# Altium footprint library 6-Connectors-1.PcbLib: 54 footprints (part 2 of 5) (continued)
## HARTING_02 04 160 1101 [mm] "PCB connector, DIN 41612, har-bus 64, 160 poles, Angled solder pins, 3.0 mm, Male contacts, Four first mating contacts, Performance level 2 as per IEC 60603-2, Row pitch: 2.54 mm, Without fixing"
height 10.7
pads (162):
  round 1.5 hole 1: a1(-2.54,-78.74) a2(-2.54,-76.2) a3(-2.54,-73.66) a4(-2.54,-71.12) a5(-2.54,-68.58) a6(-2.54,-66.04) a7(-2.54,-63.5) a8(-2.54,-60.96) a9(-2.54,-58.42) a10(-2.54,-55.88) a11(-2.54,-53.34) a12(-2.54,-50.8) a13(-2.54,-48.26) a14(-2.54,-45.72) a15(-2.54,-43.18) a16(-2.54,-40.64) a17(-2.54,-38.1) a18(-2.54,-35.56) a19(-2.54,-33.02) a20(-2.54,-30.48) a21(-2.54,-27.94) a22(-2.54,-25.4) a23(-2.54,-22.86) a24(-2.54,-20.32) a25(-2.54,-17.78) a26(-2.54,-15.24) a27(-2.54,-12.7) a28(-2.54,-10.16) a29(-2.54,-7.62) a30(-2.54,-5.08) a31(-2.54,-2.54) a32(-2.54,0) b1(-5.08,-78.74) b2(-5.08,-76.2) b3(-5.08,-73.66) b4(-5.08,-71.12) b5(-5.08,-68.58) b6(-5.08,-66.04) b7(-5.08,-63.5) b8(-5.08,-60.96) b9(-5.08,-58.42) b10(-5.08,-55.88) b11(-5.08,-53.34) b12(-5.08,-50.8) b13(-5.08,-48.26) b14(-5.08,-45.72) b15(-5.08,-43.18) b16(-5.08,-40.64) b17(-5.08,-38.1) b18(-5.08,-35.56) b19(-5.08,-33.02) b20(-5.08,-30.48) b21(-5.08,-27.94) b22(-5.08,-25.4) b23(-5.08,-22.86) b24(-5.08,-20.32) b25(-5.08,-17.78) b26(-5.08,-15.24) b27(-5.08,-12.7) b28(-5.08,-10.16) b29(-5.08,-7.62) b30(-5.08,-5.08) b31(-5.08,-2.54) b32(-5.08,0) c1(-7.62,-78.74) c2(-7.62,-76.2) c3(-7.62,-73.66) c4(-7.62,-71.12) c5(-7.62,-68.58) c6(-7.62,-66.04) c7(-7.62,-63.5) c8(-7.62,-60.96) c9(-7.62,-58.42) c10(-7.62,-55.88) c11(-7.62,-53.34) c12(-7.62,-50.8) c13(-7.62,-48.26) c14(-7.62,-45.72) c15(-7.62,-43.18) c16(-7.62,-40.64) c17(-7.62,-38.1) c18(-7.62,-35.56) c19(-7.62,-33.02) c20(-7.62,-30.48) c21(-7.62,-27.94) c22(-7.62,-25.4) c23(-7.62,-22.86) c24(-7.62,-20.32) c25(-7.62,-17.78) c26(-7.62,-15.24) c27(-7.62,-12.7) c28(-7.62,-10.16) c29(-7.62,-7.62) c30(-7.62,-5.08) c31(-7.62,-2.54) c32(-7.62,0) d1(-10.16,-78.74) d2(-10.16,-76.2) d3(-10.16,-73.66) d4(-10.16,-71.12) d5(-10.16,-68.58) d6(-10.16,-66.04) d7(-10.16,-63.5) d8(-10.16,-60.96) d9(-10.16,-58.42) d10(-10.16,-55.88) d11(-10.16,-53.34) d12(-10.16,-50.8) d13(-10.16,-48.26) d14(-10.16,-45.72) d15(-10.16,-43.18) d16(-10.16,-40.64) d17(-10.16,-38.1) d18(-10.16,-35.56) d19(-10.16,-33.02) d20(-10.16,-30.48) d21(-10.16,-27.94) d22(-10.16,-25.4) d23(-10.16,-22.86) d24(-10.16,-20.32) d25(-10.16,-17.78) d26(-10.16,-15.24) d27(-10.16,-12.7) d28(-10.16,-10.16) d29(-10.16,-7.62) d30(-10.16,-5.08) d31(-10.16,-2.54) d32(-10.16,0) z1(0,-78.74) z2(0,-76.2) z3(0,-73.66) z4(0,-71.12) z5(0,-68.58) z6(0,-66.04) z7(0,-63.5) z8(0,-60.96) z9(0,-58.42) z10(0,-55.88) z11(0,-53.34) z12(0,-50.8) z13(0,-48.26) z14(0,-45.72) z15(0,-43.18) z16(0,-40.64) z17(0,-38.1) z18(0,-35.56) z19(0,-33.02) z20(0,-30.48) z21(0,-27.94) z22(0,-25.4) z23(0,-22.86) z24(0,-20.32) z25(0,-17.78) z26(0,-15.24) z27(0,-12.7) z28(0,-10.16) z29(0,-7.62) z30(0,-5.08) z31(0,-2.54) z32(0,0)
  round 3.5 / inner round 3.5 / far side round 5.1 hole 2.8: MTG1(0,5.08) MTG2(0,-83.82)
Top Overlay:
  lines w0.2: -6.4,-83.82 -2.944,-83.82 ; -6.4,-80.77 -12.3,-80.77 -12.3,1.53 -6.4,1.53 ; -6.4,5.08 -2.944,5.08 ; -1.15,-86.27 -6.4,-86.27 -6.4,7.53 -1.15,7.53 ; 1.3,-86.27 ccw(c1.3,-84.67) 2.9,-84.67 2.9,-82.57 4.1,-81.37 4.1,-80.77 ; 1.3,7.53 cw(c1.3,5.93) 2.9,5.93 2.9,3.83 4.1,2.63 4.1,2.08 ; 3.7,-81.77 12.6,-81.77 12.6,3.03 3.7,3.03 ; 12.6,-80.77 1.25,-80.77 1.25,2.03 12.6,2.03
  text "1" at -13.5,-79.315 h1.2
  text "32" at -15.03,-0.615 h1.2
  text "5" at -13.955,-69.195 h1.2
  text "10" at -14.825,-56.505 h1.2
  text "15" at -14.825,-43.805 h1.2
  text "20" at -15.005,-31.115 h1.2
  text "25" at -15.055,-18.39 h1.2
  text "30" at -15.005,-5.69 h1.2
  text "c" at -8.128,2.262 h1.2
  text "b" at -5.461,1.317 h1.2
  text "a" at -2.921,1.317 h1.2
  text "z" at -0.35,1.317 h1.2
  text "d" at -10.795,2.262 h1.2
Mechanical 1:
  text "d" at -10.795,2.262 h1.2
  text "z" at -0.35,1.317 h1.2
  text "a" at -2.921,1.317 h1.2
  text "b" at -5.461,1.317 h1.2
  text "c" at -8.128,2.262 h1.2
Mechanical 8:
  drawing of 686 lines, arcs and shapes, not listed
  text "PCB" at 2.54,-41.275 h1.5
Mechanical 14:
  drawing of 224 lines, arcs and shapes, not listed
  text "1" at -13.5,-79.315 h1.2
  text "32" at -15.03,-0.615 h1.2
  text "5" at -13.955,-69.195 h1.2
  text "10" at -14.825,-56.505 h1.2
  text "15" at -14.825,-43.805 h1.2
  text "20" at -15.005,-31.115 h1.2
  text "25" at -15.055,-18.39 h1.2
  text "30" at -15.005,-5.69 h1.2
3D body "HARTING_02 04 160 1101.stp": height 10.65, standoff -2.95, extent -12.3,-86.27 12.6,7.53

## HARTING_02 07 160 1101 [mm] "Extender Card Female Connector; Har-bus 64, 17mm Pres-in Terminations; Rows z+a+b+c+d, 160 Female Contacts"
height 11.95
pads (162):
  round 1.7 hole 1: a1(-2.54,-78.74) a2(-2.54,-76.2) a3(-2.54,-73.66) a4(-2.54,-71.12) a5(-2.54,-68.58) a6(-2.54,-66.04) a7(-2.54,-63.5) a8(-2.54,-60.96) a9(-2.54,-58.42) a10(-2.54,-55.88) a11(-2.54,-53.34) a12(-2.54,-50.8) a13(-2.54,-48.26) a14(-2.54,-45.72) a15(-2.54,-43.18) a16(-2.54,-40.64) a17(-2.54,-38.1) a18(-2.54,-35.56) a19(-2.54,-33.02) a20(-2.54,-30.48) a21(-2.54,-27.94) a22(-2.54,-25.4) a23(-2.54,-22.86) a24(-2.54,-20.32) a25(-2.54,-17.78) a26(-2.54,-15.24) a27(-2.54,-12.7) a28(-2.54,-10.16) a29(-2.54,-7.62) a30(-2.54,-5.08) a31(-2.54,-2.54) a32(-2.54,0) b1(-5.08,-78.74) b2(-5.08,-76.2) b3(-5.08,-73.66) b4(-5.08,-71.12) b5(-5.08,-68.58) b6(-5.08,-66.04) b7(-5.08,-63.5) b8(-5.08,-60.96) b9(-5.08,-58.42) b10(-5.08,-55.88) b11(-5.08,-53.34) b12(-5.08,-50.8) b13(-5.08,-48.26) b14(-5.08,-45.72) b15(-5.08,-43.18) b16(-5.08,-40.64) b17(-5.08,-38.1) b18(-5.08,-35.56) b19(-5.08,-33.02) b20(-5.08,-30.48) b21(-5.08,-27.94) b22(-5.08,-25.4) b23(-5.08,-22.86) b24(-5.08,-20.32) b25(-5.08,-17.78) b26(-5.08,-15.24) b27(-5.08,-12.7) b28(-5.08,-10.16) b29(-5.08,-7.62) b30(-5.08,-5.08) b31(-5.08,-2.54) b32(-5.08,0) c1(-7.62,-78.74) c2(-7.62,-76.2) c3(-7.62,-73.66) c4(-7.62,-71.12) c5(-7.62,-68.58) c6(-7.62,-66.04) c7(-7.62,-63.5) c8(-7.62,-60.96) c9(-7.62,-58.42) c10(-7.62,-55.88) c11(-7.62,-53.34) c12(-7.62,-50.8) c13(-7.62,-48.26) c14(-7.62,-45.72) c15(-7.62,-43.18) c16(-7.62,-40.64) c17(-7.62,-38.1) c18(-7.62,-35.56) c19(-7.62,-33.02) c20(-7.62,-30.48) c21(-7.62,-27.94) c22(-7.62,-25.4) c23(-7.62,-22.86) c24(-7.62,-20.32) c25(-7.62,-17.78) c26(-7.62,-15.24) c27(-7.62,-12.7) c28(-7.62,-10.16) c29(-7.62,-7.62) c30(-7.62,-5.08) c31(-7.62,-2.54) c32(-7.62,0) d1(-10.16,-78.74) d2(-10.16,-76.2) d3(-10.16,-73.66) d4(-10.16,-71.12) d5(-10.16,-68.58) d6(-10.16,-66.04) d7(-10.16,-63.5) d8(-10.16,-60.96) d9(-10.16,-58.42) d10(-10.16,-55.88) d11(-10.16,-53.34) d12(-10.16,-50.8) d13(-10.16,-48.26) d14(-10.16,-45.72) d15(-10.16,-43.18) d16(-10.16,-40.64) d17(-10.16,-38.1) d18(-10.16,-35.56) d19(-10.16,-33.02) d20(-10.16,-30.48) d21(-10.16,-27.94) d22(-10.16,-25.4) d23(-10.16,-22.86) d24(-10.16,-20.32) d25(-10.16,-17.78) d26(-10.16,-15.24) d27(-10.16,-12.7) d28(-10.16,-10.16) d29(-10.16,-7.62) d30(-10.16,-5.08) d31(-10.16,-2.54) d32(-10.16,0) z1(0,-78.74) z2(0,-76.2) z3(0,-73.66) z4(0,-71.12) z5(0,-68.58) z6(0,-66.04) z7(0,-63.5) z8(0,-60.96) z9(0,-58.42) z10(0,-55.88) z11(0,-53.34) z12(0,-50.8) z13(0,-48.26) z14(0,-45.72) z15(0,-43.18) z16(0,-40.64) z17(0,-38.1) z18(0,-35.56) z19(0,-33.02) z20(0,-30.48) z21(0,-27.94) z22(0,-25.4) z23(0,-22.86) z24(0,-20.32) z25(0,-17.78) z26(0,-15.24) z27(0,-12.7) z28(0,-10.16) z29(0,-7.62) z30(0,-5.08) z31(0,-2.54) z32(0,0)
  round 3.5 / inner round 3.5 / far side round 5.1 hole 2.8: MTG1(0,5.08) MTG2(0,-83.82)
Top Overlay:
  lines w0.2: -6.4,-83.82 -2.944,-83.82 -2.652,-83.314 ; -6.4,-80.77 -6.4,-86.37 -0.887,-86.37 ; -6.4,1.53 -6.4,7.63 -0.887,7.63 ; -6.4,5.08 -2.944,5.08 -2.652,4.574 ; -1.765,-81.777 -1.472,-81.27 -0.887,-81.27 ; -1.765,3.036 -1.472,2.53 -0.887,2.53 ; 0.887,-86.37 12.6,-86.37 ; 0.887,-81.27 1.472,-81.27 1.765,-81.777 ; 0.887,2.53 1.472,2.53 1.765,3.036 ; 0.887,7.63 12.6,7.63 ; 1.25,-80.77 1.25,2.03 12.6,2.03 ; 1.25,1.53 -12.6,1.53 -12.6,-80.77 12.6,-80.77 ; 2.579,-83.02 2.9,-83.02 2.9,-82.57 4.1,-81.37 4.1,-80.77 ; 2.579,4.28 2.9,4.28 2.9,3.83 4.1,2.63 4.1,2.03 ; 12,-80.77 12,2.03 ; 12.6,-81.87 25.57,-81.87 26.2,-81.24 26.2,2.5 25.57,3.13 12.6,3.13 ; 14.6,-86.67 12.6,-86.67 12.6,7.93 14.6,7.93 ; 15.1,-81.87 15.1,3.13 ; 16.55,-81.87 16.55,3.13 ; 18.5,-82.27 18.504,-82.27 cw(c18.504,-82.97) 19.204,-82.97 19.204,-84.37 ; 18.5,-81.87 18.5,-84.37 19.65,-84.37 19.65,-86.82 14.6,-86.82 14.6,8.08 19.65,8.08 19.65,5.63 18.5,5.63 18.5,3.13 ; 18.503,3.53 ccw(c18.503,4.23) 19.203,4.23 19.203,5.63 ; 25.9,-81.54 25.9,2.8
  text "30" at -15.305,-5.69 h1.2
  text "25" at -15.355,-18.39 h1.2
  text "20" at -15.305,-31.115 h1.2
  text "15" at -15.125,-43.805 h1.2
  text "10" at -15.125,-56.505 h1.2
  text "5" at -14.255,-69.195 h1.2
  text "32" at -15.33,-0.615 h1.2
  text "b" at -5.53,2.225 h1.2
  text "a" at -3.365,2.215 h1.2
  text "1" at -13.8,-79.315 h1.2
  text "c" at -8.13,2.2 h1.2
  text "d" at -10.705,2.175 h1.2
Mechanical 8:
  lines w0.1: -10.66,-78.74 -10.16,-78.74 ; -10.66,0 -10.16,0 ; -10.16,-79.24 -10.16,-78.74 ; -10.16,-78.24 -10.16,-78.74 ; -10.16,-0.5 -10.16,0 ; -10.16,0.5 -10.16,0 ; -9.66,-78.74 -10.16,-78.74 ; -9.66,0 -10.16,0 ; -8.12,-78.74 -7.62,-78.74 ; -8.12,0 -7.62,0 ; -7.62,-79.24 -7.62,-78.74 ; -7.62,-78.24 -7.62,-78.74 ; -7.62,-0.5 -7.62,0 ; -7.62,0.5 -7.62,0 ; -7.12,-78.74 -7.62,-78.74 ; -7.12,0 -7.62,0 ; -5.58,-78.74 -5.08,-78.74 ; -5.58,0 -5.08,0 ; -5.434,-39.724 -5.08,-39.37 ; -5.434,-39.016 -5.08,-39.37 ; -5.08,-79.24 -5.08,-78.74 ; -5.08,-78.24 -5.08,-78.74 ; -5.08,-0.5 -5.08,0 ; -5.08,0.5 -5.08,0 ; -4.726,-39.724 -5.08,-39.37 ; -4.726,-39.016 -5.08,-39.37 ; -4.58,-78.74 -5.08,-78.74 ; -4.58,0 -5.08,0 ; -3.04,-78.74 -2.54,-78.74 ; -3.04,0 -2.54,0 ; -2.54,-79.24 -2.54,-78.74 ; -2.54,-78.24 -2.54,-78.74 ; -2.54,-0.5 -2.54,0 ; -2.54,0.5 -2.54,0 ; -2.04,-78.74 -2.54,-78.74 ; -2.04,0 -2.54,0 ; -0.5,-83.82 0,-83.82 ; -0.5,-78.74 0,-78.74 ; -0.5,0 0,0 ; -0.5,5.08 0,5.08 ; 0,-84.32 0,-83.82 ; 0,-83.32 0,-83.82 ; 0,-79.24 0,-78.74 ; 0,-78.24 0,-78.74 ; 0,-0.5 0,0 ; 0,0.5 0,0 ; 0,4.58 0,5.08 ; 0,5.58 0,5.08 ; 0.5,-83.82 0,-83.82 ; 0.5,-78.74 0,-78.74 ; 0.5,0 0,0 ; 0.5,5.08 0,5.08 ; 2.76,-88.82 2.76,-39.37 2.76,10.08
Mechanical 14:
  circle w0.1: c0,5.08 r1.25
  circle w0.1: c0,-83.82 r1.25
  lines w0.1: -6.4,-83.82 -2.944,-83.82 -1.472,-81.27 1.472,-81.27 2.483,-83.02 2.9,-83.02 2.9,-82.57 4.1,-81.37 4.1,-80.77 ; -6.4,5.08 -2.944,5.08 -1.472,2.53 1.472,2.53 2.483,4.28 2.9,4.28 2.9,3.83 4.1,2.63 4.1,2.03 ; 1.25,-80.77 1.25,2.03 12.6,2.03 ; 1.25,1.53 -12.6,1.53 -12.6,-80.77 12.6,-80.77 ; 12,-80.77 12,2.03 ; 12.6,-86.37 -6.4,-86.37 -6.4,7.63 12.6,7.63 ; 12.6,-81.87 25.57,-81.87 26.2,-81.24 26.2,2.5 25.57,3.13 12.6,3.13 ; 14.6,-86.67 12.6,-86.67 12.6,7.93 14.6,7.93 ; 15.1,-81.87 15.1,3.13 ; 16.55,-81.87 16.55,3.13 ; 18.5,-82.27 18.504,-82.27 cw(c18.504,-82.97) 19.204,-82.97 19.204,-84.37 ; 18.5,-81.87 18.5,-84.37 19.65,-84.37 19.65,-86.82 14.6,-86.82 14.6,8.08 19.65,8.08 19.65,5.63 18.5,5.63 18.5,3.13 ; 18.503,3.53 ccw(c18.503,4.23) 19.203,4.23 19.203,5.63 ; 25.9,-81.54 25.9,2.8
  text "30" at -15.305,-5.69 h1.2
  text "25" at -15.355,-18.39 h1.2
  text "20" at -15.305,-31.115 h1.2
  text "15" at -15.125,-43.805 h1.2
  text "10" at -15.125,-56.505 h1.2
  text "5" at -14.255,-69.195 h1.2
  text "32" at -15.33,-0.615 h1.2
  text "b" at -5.53,2.225 h1.2
  text "a" at -3.365,2.215 h1.2
  text "z" at 1.7,-0.375 h1.2
  text "1" at -13.8,-79.315 h1.2
  text "c" at -8.13,2.2 h1.2
  text "d" at -10.705,2.175 h1.2
3D body "HARTING_02 07 160 1101.stp": height 11.95, standoff -4.05, extent -12.6,-86.82 26.2,8.08

## HARTING_09 65 321 7701 [mm] "Straight D-Sub 25 Male Contacts with M3 Nut Thread"
height 12.2
pads (27):
  round 1.5 hole 1: 1(-16.56,1.42) 2(-13.8,1.42) 3(-11.04,1.42) 4(-8.28,1.42) 5(-5.52,1.42) 6(-2.76,1.42) 7(0,1.42) 8(2.76,1.42) 9(5.52,1.42) 10(8.28,1.42) 11(11.04,1.42) 12(13.8,1.42) 13(16.56,1.42) 14(-15.18,-1.42) 15(-12.42,-1.42) 16(-9.66,-1.42) 17(-6.9,-1.42) 18(-4.14,-1.42) 19(-1.38,-1.42) 20(1.38,-1.42) 21(4.14,-1.42) 22(6.9,-1.42) 23(9.66,-1.42) 24(12.42,-1.42) 25(15.18,-1.42)
  round 5.5 hole 3.2: 26(23.52,0) 27(-23.52,0)
Top Overlay:
  circle w0.5: c-16.56,7.42 r0.25
  lines w0.2: -26.6,-4.75 ccw(c-25.1,-4.75) -25.1,-6.25 25.1,-6.25 ccw(c25.1,-4.75) 26.6,-4.75 26.6,4.75 ccw(c25.1,4.75) 25.1,6.25 -25.1,6.25 ccw(c-25.1,4.75) -26.6,4.75 -26.6,-4.75 ; -19.883,0.977 cw(c-16.83,1.515) -16.83,4.615 16.83,4.615 cw(c16.83,1.515) 19.883,0.977 19.349,-2.053 cw(c16.296,-1.515) 16.296,-4.615 -16.296,-4.615 cw(c-16.296,-1.515) -19.349,-2.053 -19.883,0.977
  text "25" at 14,-4.2 h1.5
  text "1" at -16.8,2.7 h1.5
  text "14" at -16.3,-4.2 h1.5
  text "13" at 15.6,2.7 h1.5
Mechanical 8:
  lines w0.1: -24.52,0 -23.52,0 ; -23.52,-1 -23.52,0 ; -23.52,1 -23.52,0 ; -22.52,0 -23.52,0 ; -17.56,1.42 -16.56,1.42 ; -16.56,0.42 -16.56,1.42 ; -16.56,2.42 -16.56,1.42 ; -16.18,-1.42 -15.18,-1.42 ; -15.56,1.42 -16.56,1.42 ; -15.18,-2.42 -15.18,-1.42 ; -15.18,-0.42 -15.18,-1.42 ; -14.8,1.42 -13.8,1.42 ; -14.18,-1.42 -15.18,-1.42 ; -13.8,0.42 -13.8,1.42 ; -13.8,2.42 -13.8,1.42 ; -13.42,-1.42 -12.42,-1.42 ; -12.8,1.42 -13.8,1.42 ; -12.42,-2.42 -12.42,-1.42 ; -12.42,-0.42 -12.42,-1.42 ; -12.04,1.42 -11.04,1.42 ; -11.42,-1.42 -12.42,-1.42 ; -11.04,0.42 -11.04,1.42 ; -11.04,2.42 -11.04,1.42 ; -10.66,-1.42 -9.66,-1.42 ; -10.04,1.42 -11.04,1.42 ; -9.66,-2.42 -9.66,-1.42 ; -9.66,-0.42 -9.66,-1.42 ; -9.28,1.42 -8.28,1.42 ; -8.66,-1.42 -9.66,-1.42 ; -8.28,0.42 -8.28,1.42 ; -8.28,2.42 -8.28,1.42 ; -7.9,-1.42 -6.9,-1.42 ; -7.28,1.42 -8.28,1.42 ; -6.9,-2.42 -6.9,-1.42 ; -6.9,-0.42 -6.9,-1.42 ; -6.52,1.42 -5.52,1.42 ; -5.9,-1.42 -6.9,-1.42 ; -5.52,0.42 -5.52,1.42 ; -5.52,2.42 -5.52,1.42 ; -5.14,-1.42 -4.14,-1.42 ; -4.52,1.42 -5.52,1.42 ; -4.14,-2.42 -4.14,-1.42 ; -4.14,-0.42 -4.14,-1.42 ; -3.76,1.42 -2.76,1.42 ; -3.14,-1.42 -4.14,-1.42 ; -2.76,0.42 -2.76,1.42 ; -2.76,2.42 -2.76,1.42 ; -2.38,-1.42 -1.38,-1.42 ; -1.76,1.42 -2.76,1.42 ; -1.38,-2.42 -1.38,-1.42 ; -1.38,-0.42 -1.38,-1.42 ; -1,0 0,0 ; -1,1.42 0,1.42 ; -0.38,-1.42 -1.38,-1.42 ; 0,-1 0,0 ; 0,0.42 0,1.42 ; 0,1 0,0 ; 0,2.42 0,1.42 ; 0.38,-1.42 1.38,-1.42 ; 1,0 0,0 ; 1,1.42 0,1.42 ; 1.38,-2.42 1.38,-1.42 ; 1.38,-0.42 1.38,-1.42 ; 1.76,1.42 2.76,1.42 ; 2.38,-1.42 1.38,-1.42 ; 2.76,0.42 2.76,1.42 ; 2.76,2.42 2.76,1.42 ; 3.14,-1.42 4.14,-1.42 ; 3.76,1.42 2.76,1.42 ; 4.14,-2.42 4.14,-1.42 ; 4.14,-0.42 4.14,-1.42 ; 4.52,1.42 5.52,1.42 ; 5.14,-1.42 4.14,-1.42 ; 5.52,0.42 5.52,1.42 ; 5.52,2.42 5.52,1.42 ; 5.9,-1.42 6.9,-1.42 ; 6.52,1.42 5.52,1.42 ; 6.9,-2.42 6.9,-1.42 ; 6.9,-0.42 6.9,-1.42 ; 7.28,1.42 8.28,1.42 ; 7.9,-1.42 6.9,-1.42 ; 8.28,0.42 8.28,1.42 ; 8.28,2.42 8.28,1.42 ; 8.66,-1.42 9.66,-1.42 ; 9.28,1.42 8.28,1.42 ; 9.66,-2.42 9.66,-1.42 ; 9.66,-0.42 9.66,-1.42 ; 10.04,1.42 11.04,1.42 ; 10.66,-1.42 9.66,-1.42 ; 11.04,0.42 11.04,1.42 ; 11.04,2.42 11.04,1.42 ; 11.42,-1.42 12.42,-1.42 ; 12.04,1.42 11.04,1.42 ; 12.42,-2.42 12.42,-1.42 ; 12.42,-0.42 12.42,-1.42 ; 12.8,1.42 13.8,1.42 ; 13.42,-1.42 12.42,-1.42 ; 13.8,0.42 13.8,1.42 ; 13.8,2.42 13.8,1.42 ; 14.18,-1.42 15.18,-1.42 ; 14.8,1.42 13.8,1.42 ; 15.18,-2.42 15.18,-1.42 ; 15.18,-0.42 15.18,-1.42 ; 15.56,1.42 16.56,1.42 ; 16.18,-1.42 15.18,-1.42 ; 16.56,0.42 16.56,1.42 ; 16.56,2.42 16.56,1.42 ; 17.56,1.42 16.56,1.42 ; 22.52,0 23.52,0 ; 23.52,-1 23.52,0 ; 23.52,1 23.52,0 ; 24.52,0 23.52,0
Mechanical 14:
  circle w0.1: c-23.52,0 r1.5
  circle w0.1: c23.52,0 r1.5
  lines w0.1: -26.6,-4.75 ccw(c-25.1,-4.75) -25.1,-6.25 25.1,-6.25 ccw(c25.1,-4.75) 26.6,-4.75 26.6,4.75 ccw(c25.1,4.75) 25.1,6.25 -25.1,6.25 ccw(c-25.1,4.75) -26.6,4.75 -26.6,-4.75 ; -19.883,0.977 cw(c-16.83,1.515) -16.83,4.615 16.83,4.615 cw(c16.83,1.515) 19.883,0.977 19.349,-2.053 cw(c16.296,-1.515) 16.296,-4.615 -16.296,-4.615 cw(c-16.296,-1.515) -19.349,-2.053 -19.883,0.977 ; -19.391,1.064 cw(c-16.83,1.515) -16.83,4.115 16.83,4.115 cw(c16.83,1.515) 19.391,1.064 18.856,-1.966 cw(c16.296,-1.515) 16.296,-4.115 -16.296,-4.115 cw(c-16.296,-1.515) -18.856,-1.966 -19.391,1.064
3D body "HARTING_09 65 321 7701.stp": height 12.2, standoff -4, extent -26.6,-6.25 26.6,6.25

## HARTING_09 66 111 7501 [mm] "Straight D-SUB 9 Female Contacts with M3 Nut Thread"
height 12.33
pads (11):
  round 1.5 hole 1: 1(5.48,1.42) 2(2.74,1.42) 3(0,1.42) 4(-2.74,1.42) 5(-5.48,1.42) 6(4.11,-1.42) 7(1.37,-1.42) 8(-1.37,-1.42) 9(-4.11,-1.42)
  round 5.5 hole 3.2: 10(-12.495,0) 11(12.495,0)
Top Overlay:
  circle w0.5: c5.48,7.42 r0.25
  lines w0.2: -15.6,-4.75 ccw(c-14.1,-4.75) -14.1,-6.25 14.1,-6.25 ccw(c14.1,-4.75) 15.6,-4.75 15.6,4.75 ccw(c14.1,4.75) 14.1,6.25 -14.1,6.25 ccw(c-14.1,4.75) -15.6,4.75 -15.6,-4.75 ; -8.166,0.949 cw(c-5.605,1.4) -5.605,4 5.605,4 cw(c5.605,1.4) 8.166,0.949 7.672,-1.851 cw(c5.111,-1.4) 5.111,-4 -5.111,-4 cw(c-5.111,-1.4) -7.672,-1.851 -8.166,0.949
  text "5" at -7.5,0.7 h1.5
  text "1" at 6.78,0.67 h1.5
  text "6" at 5.41,-2.17 h1.5
  text "9" at -6.41,-2.17 h1.5
Mechanical 8:
  lines w0.1: -6.48,1.42 -5.48,1.42 ; -5.48,0.42 -5.48,1.42 ; -5.48,2.42 -5.48,1.42 ; -5.11,-1.42 -4.11,-1.42 ; -4.48,1.42 -5.48,1.42 ; -4.11,-2.42 -4.11,-1.42 ; -4.11,-0.42 -4.11,-1.42 ; -3.74,1.42 -2.74,1.42 ; -3.11,-1.42 -4.11,-1.42 ; -2.74,0.42 -2.74,1.42 ; -2.74,2.42 -2.74,1.42 ; -2.37,-1.42 -1.37,-1.42 ; -1.74,1.42 -2.74,1.42 ; -1.37,-2.42 -1.37,-1.42 ; -1.37,-0.42 -1.37,-1.42 ; -1,0 0,0 ; -1,1.42 0,1.42 ; -0.37,-1.42 -1.37,-1.42 ; 0,-1 0,0 ; 0,0.42 0,1.42 ; 0,1 0,0 ; 0,2.42 0,1.42 ; 0.37,-1.42 1.37,-1.42 ; 1,0 0,0 ; 1,1.42 0,1.42 ; 1.37,-2.42 1.37,-1.42 ; 1.37,-0.42 1.37,-1.42 ; 1.74,1.42 2.74,1.42 ; 2.37,-1.42 1.37,-1.42 ; 2.74,0.42 2.74,1.42 ; 2.74,2.42 2.74,1.42 ; 3.11,-1.42 4.11,-1.42 ; 3.74,1.42 2.74,1.42 ; 4.11,-2.42 4.11,-1.42 ; 4.11,-0.42 4.11,-1.42 ; 4.48,1.42 5.48,1.42 ; 5.11,-1.42 4.11,-1.42 ; 5.48,0.42 5.48,1.42 ; 5.48,2.42 5.48,1.42 ; 6.48,1.42 5.48,1.42
Mechanical 14:
  circle w0.1: c12.5,0 r1.5
  circle w0.1: c-12.5,0 r1.5
  lines w0.1: -15.6,-4.75 ccw(c-14.1,-4.75) -14.1,-6.25 14.1,-6.25 ccw(c14.1,-4.75) 15.6,-4.75 15.6,4.75 ccw(c14.1,4.75) 14.1,6.25 -14.1,6.25 ccw(c-14.1,4.75) -15.6,4.75 -15.6,-4.75 ; -8.166,0.949 cw(c-5.605,1.4) -5.605,4 5.605,4 cw(c5.605,1.4) 8.166,0.949 7.672,-1.851 cw(c5.111,-1.4) 5.111,-4 -5.111,-4 cw(c-5.111,-1.4) -7.672,-1.851 -8.166,0.949 ; -7.673,1.035 cw(c-5.605,1.4) -5.605,3.5 5.605,3.5 cw(c5.605,1.4) 7.673,1.035 7.179,-1.765 cw(c5.111,-1.4) 5.111,-3.5 -5.111,-3.5 cw(c-5.111,-1.4) -7.179,-1.765 -7.673,1.035
3D body "HARTING_09 66 111 7501.stp": height 12.33, standoff -4, extent -15.6,-6.25 15.6,6.25

## HARTING_09 66 152 6612 [mm] "Right Angled D-Sub 9 Female Contacts With Grounding Board Locks And UNC 4-40 Flange"
height 13.6
pads (11):
  round 1.7 hole 1: 1(-5.48,-1.27) 2(-2.74,-1.27) 3(0,-1.27) 4(2.74,-1.27) 5(5.48,-1.27) 6(-4.11,1.27) 7(-1.37,1.27) 8(1.37,1.27) 9(4.11,1.27)
  round 5.5 hole 3.2: 10(-12.5,0) 11(12.5,0)
Top Overlay:
  lines w0.2: -15.6,7.17 15.6,7.17 ; -15.6,11.17 15.6,11.17 ; -9.15,7.17 -9.15,5.57 9.15,5.57 9.15,7.17 ; -8.6,5.57 -8.6,2.67 8.6,2.67 8.6,5.57 ; -8.205,11.67 -8.205,17.37 cw(c-7.705,17.37) -7.705,17.87 7.704,17.87 cw(c7.704,17.37) 8.204,17.37 8.204,11.67 ; -7.1,-3.33 -7.1,2.67 ; 7.1,-3.33 7.1,2.67 ; -15.6,-3.33 -15.6,11.67 15.6,11.67 15.6,-3.33 -15.6,-3.33
  text "1" at -8.439,-2.107 h1.5
  text "5" at 7.656,-2.032 h1.5
  text "6" at -8.566,0.433 h1.5
  text "9" at 7.656,0.508 h1.5
Mechanical 8:
  lines w0.1: -13,0 -12.5,0 ; -12.5,-0.5 -12.5,0 ; -12.5,0.5 -12.5,0 ; -12,0 -12.5,0 ; -5.98,-1.27 -5.48,-1.27 ; -5.48,-1.77 -5.48,-1.27 ; -5.48,-0.77 -5.48,-1.27 ; -4.98,-1.27 -5.48,-1.27 ; -4.61,1.27 -4.11,1.27 ; -4.11,0.77 -4.11,1.27 ; -4.11,1.77 -4.11,1.27 ; -3.61,1.27 -4.11,1.27 ; -3.24,-1.27 -2.74,-1.27 ; -2.74,-1.77 -2.74,-1.27 ; -2.74,-0.77 -2.74,-1.27 ; -2.24,-1.27 -2.74,-1.27 ; -1.87,1.27 -1.37,1.27 ; -1.37,0.77 -1.37,1.27 ; -1.37,1.77 -1.37,1.27 ; -0.87,1.27 -1.37,1.27 ; -0.5,-1.27 0,-1.27 ; -0.5,0 0,0 ; 0,-1.77 0,-1.27 ; 0,-0.77 0,-1.27 ; 0,-0.5 0,0 ; 0,0.5 0,0 ; 0.5,-1.27 0,-1.27 ; 0.5,0 0,0 ; 0.87,1.27 1.37,1.27 ; 1.37,0.77 1.37,1.27 ; 1.37,1.77 1.37,1.27 ; 1.87,1.27 1.37,1.27 ; 2.24,-1.27 2.74,-1.27 ; 2.74,-1.77 2.74,-1.27 ; 2.74,-0.77 2.74,-1.27 ; 3.24,-1.27 2.74,-1.27 ; 3.61,1.27 4.11,1.27 ; 4.11,0.77 4.11,1.27 ; 4.11,1.77 4.11,1.27 ; 4.61,1.27 4.11,1.27 ; 4.98,-1.27 5.48,-1.27 ; 5.48,-1.77 5.48,-1.27 ; 5.48,-0.77 5.48,-1.27 ; 5.98,-1.27 5.48,-1.27 ; 12,0 12.5,0 ; 12.5,-0.5 12.5,0 ; 12.5,0.5 12.5,0 ; 13,0 12.5,0
Mechanical 14:
  circle w0.1: c12.5,0 r1.6
  circle w0.1: c-12.5,0 r1.6
  lines w0.1: -15.6,7.17 15.6,7.17 ; -15.6,11.17 15.6,11.17 ; -9.15,7.17 -9.15,5.57 9.15,5.57 9.15,7.17 ; -8.6,5.57 -8.6,2.67 -5.78,2.67 ; -8.205,11.67 -8.205,17.37 cw(c-7.705,17.37) -7.705,17.87 7.704,17.87 cw(c7.704,17.37) 8.204,17.37 8.204,11.67 ; -7.1,-3.33 -7.1,2.67 ; -5.78,5.57 -5.78,-1.27 ccw(c-5.48,-1.27) -5.18,-1.27 -5.18,5.57 ; -5.18,2.67 -4.41,2.67 ; -4.409,5.57 -4.41,1.27 ccw(c-4.11,1.27) -3.81,1.27 -3.81,5.57 ; -3.81,2.67 -3.04,2.67 ; -3.04,5.57 -3.04,-1.27 ccw(c-2.74,-1.27) -2.44,-1.27 -2.44,5.57 ; -2.44,2.67 -1.67,2.67 ; -1.669,5.57 -1.67,1.27 ccw(c-1.37,1.27) -1.07,1.27 -1.07,5.57 ; -1.07,2.67 -0.3,2.67 ; -0.3,5.57 -0.3,-1.27 ccw(c0,-1.27) 0.3,-1.27 0.3,5.57 ; 0.3,2.67 1.07,2.67 ; 1.071,5.57 1.07,1.27 ccw(c1.37,1.27) 1.67,1.27 1.67,5.57 ; 1.67,2.67 2.44,2.67 ; 2.44,5.57 2.44,-1.27 ccw(c2.74,-1.27) 3.04,-1.27 3.04,5.57 ; 3.04,2.67 3.81,2.67 ; 3.811,5.57 3.81,1.27 ccw(c4.11,1.27) 4.41,1.27 4.41,5.57 ; 4.41,2.67 5.18,2.67 ; 5.18,5.57 5.18,-1.27 ccw(c5.48,-1.27) 5.78,-1.27 5.78,5.57 ; 5.78,2.67 8.6,2.67 8.6,5.57 ; 7.1,-3.33 7.1,2.67 ; -15.6,-3.33 -15.6,11.67 15.6,11.67 15.6,-3.33 -15.6,-3.33
  text "1" at -8.439,-2.107 h1.5
  text "6" at -8.566,0.433 h1.5
  text "9" at 7.656,0.508 h1.5
  text "5" at 7.656,-2.032 h1.5
3D body "HARTING_09 66 152 6612.stp": height 13.6, standoff -3.2, extent -15.6,-3.33 15.6,17.87

## HARTING_09 66 351 6512 [mm] "Straight D-Sub 25 Female Contacts with 4-40 UNC Flange Thread"
height 12.3
pads (27):
  round 1.5 hole 1: 1(16.56,1.42) 2(13.8,1.42) 3(11.04,1.42) 4(8.28,1.42) 5(5.52,1.42) 6(2.76,1.42) 7(0,1.42) 8(-2.76,1.42) 9(-5.52,1.42) 10(-8.28,1.42) 11(-11.04,1.42) 12(-13.8,1.42) 13(-16.56,1.42) 14(15.18,-1.42) 15(12.42,-1.42) 16(9.66,-1.42) 17(6.9,-1.42) 18(4.14,-1.42) 19(1.38,-1.42) 20(-1.38,-1.42) 21(-4.14,-1.42) 22(-6.9,-1.42) 23(-9.66,-1.42) 24(-12.42,-1.42) 25(-15.18,-1.42)
  round 5.5 hole 3.2: 26(23.52,0) 27(-23.52,0)
Top Overlay:
  circle w0.5: c16.25,7.1 r0.25
  lines w0.2: -26.6,-4.75 ccw(c-25.1,-4.75) -25.1,-6.25 25.1,-6.25 ccw(c25.1,-4.75) 26.6,-4.75 26.6,4.75 ccw(c25.1,4.75) 25.1,6.25 -25.1,6.25 ccw(c-25.1,4.75) -26.6,4.75 -26.6,-4.75 ; -19.883,0.977 cw(c-16.83,1.515) -16.83,4.615 16.83,4.615 cw(c16.83,1.515) 19.883,0.977 19.349,-2.053 cw(c16.296,-1.515) 16.296,-4.615 -16.296,-4.615 cw(c-16.296,-1.515) -19.349,-2.053 -19.883,0.977
  text "14" at 14,-4.2 h1.5
  text "13" at -17.725,2.575 h1.5
  text "25" at -16.3,-4.2 h1.5
  text "1" at 16.25,2.75 h1.5
Mechanical 8:
  lines w0.1: -24.52,0 -23.52,0 ; -23.52,-1 -23.52,0 ; -23.52,1 -23.52,0 ; -22.52,0 -23.52,0 ; -17.56,1.42 -16.56,1.42 ; -16.56,0.42 -16.56,1.42 ; -16.56,2.42 -16.56,1.42 ; -16.18,-1.42 -15.18,-1.42 ; -15.56,1.42 -16.56,1.42 ; -15.18,-2.42 -15.18,-1.42 ; -15.18,-0.42 -15.18,-1.42 ; -14.8,1.42 -13.8,1.42 ; -14.18,-1.42 -15.18,-1.42 ; -13.8,0.42 -13.8,1.42 ; -13.8,2.42 -13.8,1.42 ; -13.42,-1.42 -12.42,-1.42 ; -12.8,1.42 -13.8,1.42 ; -12.42,-2.42 -12.42,-1.42 ; -12.42,-0.42 -12.42,-1.42 ; -12.04,1.42 -11.04,1.42 ; -11.42,-1.42 -12.42,-1.42 ; -11.04,0.42 -11.04,1.42 ; -11.04,2.42 -11.04,1.42 ; -10.66,-1.42 -9.66,-1.42 ; -10.04,1.42 -11.04,1.42 ; -9.66,-2.42 -9.66,-1.42 ; -9.66,-0.42 -9.66,-1.42 ; -9.28,1.42 -8.28,1.42 ; -8.66,-1.42 -9.66,-1.42 ; -8.28,0.42 -8.28,1.42 ; -8.28,2.42 -8.28,1.42 ; -7.9,-1.42 -6.9,-1.42 ; -7.28,1.42 -8.28,1.42 ; -6.9,-2.42 -6.9,-1.42 ; -6.9,-0.42 -6.9,-1.42 ; -6.52,1.42 -5.52,1.42 ; -5.9,-1.42 -6.9,-1.42 ; -5.52,0.42 -5.52,1.42 ; -5.52,2.42 -5.52,1.42 ; -5.14,-1.42 -4.14,-1.42 ; -4.52,1.42 -5.52,1.42 ; -4.14,-2.42 -4.14,-1.42 ; -4.14,-0.42 -4.14,-1.42 ; -3.76,1.42 -2.76,1.42 ; -3.14,-1.42 -4.14,-1.42 ; -2.76,0.42 -2.76,1.42 ; -2.76,2.42 -2.76,1.42 ; -2.38,-1.42 -1.38,-1.42 ; -1.76,1.42 -2.76,1.42 ; -1.38,-2.42 -1.38,-1.42 ; -1.38,-0.42 -1.38,-1.42 ; -1,0 0,0 ; -1,1.42 0,1.42 ; -0.38,-1.42 -1.38,-1.42 ; 0,-1 0,0 ; 0,0.42 0,1.42 ; 0,1 0,0 ; 0,2.42 0,1.42 ; 0.38,-1.42 1.38,-1.42 ; 1,0 0,0 ; 1,1.42 0,1.42 ; 1.38,-2.42 1.38,-1.42 ; 1.38,-0.42 1.38,-1.42 ; 1.76,1.42 2.76,1.42 ; 2.38,-1.42 1.38,-1.42 ; 2.76,0.42 2.76,1.42 ; 2.76,2.42 2.76,1.42 ; 3.14,-1.42 4.14,-1.42 ; 3.76,1.42 2.76,1.42 ; 4.14,-2.42 4.14,-1.42 ; 4.14,-0.42 4.14,-1.42 ; 4.52,1.42 5.52,1.42 ; 5.14,-1.42 4.14,-1.42 ; 5.52,0.42 5.52,1.42 ; 5.52,2.42 5.52,1.42 ; 5.9,-1.42 6.9,-1.42 ; 6.52,1.42 5.52,1.42 ; 6.9,-2.42 6.9,-1.42 ; 6.9,-0.42 6.9,-1.42 ; 7.28,1.42 8.28,1.42 ; 7.9,-1.42 6.9,-1.42 ; 8.28,0.42 8.28,1.42 ; 8.28,2.42 8.28,1.42 ; 8.66,-1.42 9.66,-1.42 ; 9.28,1.42 8.28,1.42 ; 9.66,-2.42 9.66,-1.42 ; 9.66,-0.42 9.66,-1.42 ; 10.04,1.42 11.04,1.42 ; 10.66,-1.42 9.66,-1.42 ; 11.04,0.42 11.04,1.42 ; 11.04,2.42 11.04,1.42 ; 11.42,-1.42 12.42,-1.42 ; 12.04,1.42 11.04,1.42 ; 12.42,-2.42 12.42,-1.42 ; 12.42,-0.42 12.42,-1.42 ; 12.8,1.42 13.8,1.42 ; 13.42,-1.42 12.42,-1.42 ; 13.8,0.42 13.8,1.42 ; 13.8,2.42 13.8,1.42 ; 14.18,-1.42 15.18,-1.42 ; 14.8,1.42 13.8,1.42 ; 15.18,-2.42 15.18,-1.42 ; 15.18,-0.42 15.18,-1.42 ; 15.56,1.42 16.56,1.42 ; 16.18,-1.42 15.18,-1.42 ; 16.56,0.42 16.56,1.42 ; 16.56,2.42 16.56,1.42 ; 17.56,1.42 16.56,1.42 ; 22.52,0 23.52,0 ; 23.52,-1 23.52,0 ; 23.52,1 23.52,0 ; 24.52,0 23.52,0
Mechanical 14:
  circle w0.1: c-23.52,0 r1.5
  circle w0.1: c23.52,0 r1.5
  lines w0.1: -26.6,-4.75 ccw(c-25.1,-4.75) -25.1,-6.25 25.1,-6.25 ccw(c25.1,-4.75) 26.6,-4.75 26.6,4.75 ccw(c25.1,4.75) 25.1,6.25 -25.1,6.25 ccw(c-25.1,4.75) -26.6,4.75 -26.6,-4.75 ; -19.883,0.977 cw(c-16.83,1.515) -16.83,4.615 16.83,4.615 cw(c16.83,1.515) 19.883,0.977 19.349,-2.053 cw(c16.296,-1.515) 16.296,-4.615 -16.296,-4.615 cw(c-16.296,-1.515) -19.349,-2.053 -19.883,0.977 ; -19.391,1.064 cw(c-16.83,1.515) -16.83,4.115 16.83,4.115 cw(c16.83,1.515) 19.391,1.064 18.856,-1.966 cw(c16.296,-1.515) 16.296,-4.115 -16.296,-4.115 cw(c-16.296,-1.515) -18.856,-1.966 -19.391,1.064
3D body "HARTING_09 66 351 6512.stp": height 12.33, standoff -4, extent -26.6,-6.25 26.6,6.25